# Altium footprint library PCB_Footprints.PcbLib: 303 footprints (part 1 of 19)
Each footprint in its own frame and in the unit in brackets; x right, y up, seen from the top. Pads: shape width x height; smd on the part's side, far side on the other; paste and mask are expansions set on the pad; w line width, h text height; cw(c..) or ccw(c..) is an arc to the next point about the centre after c.
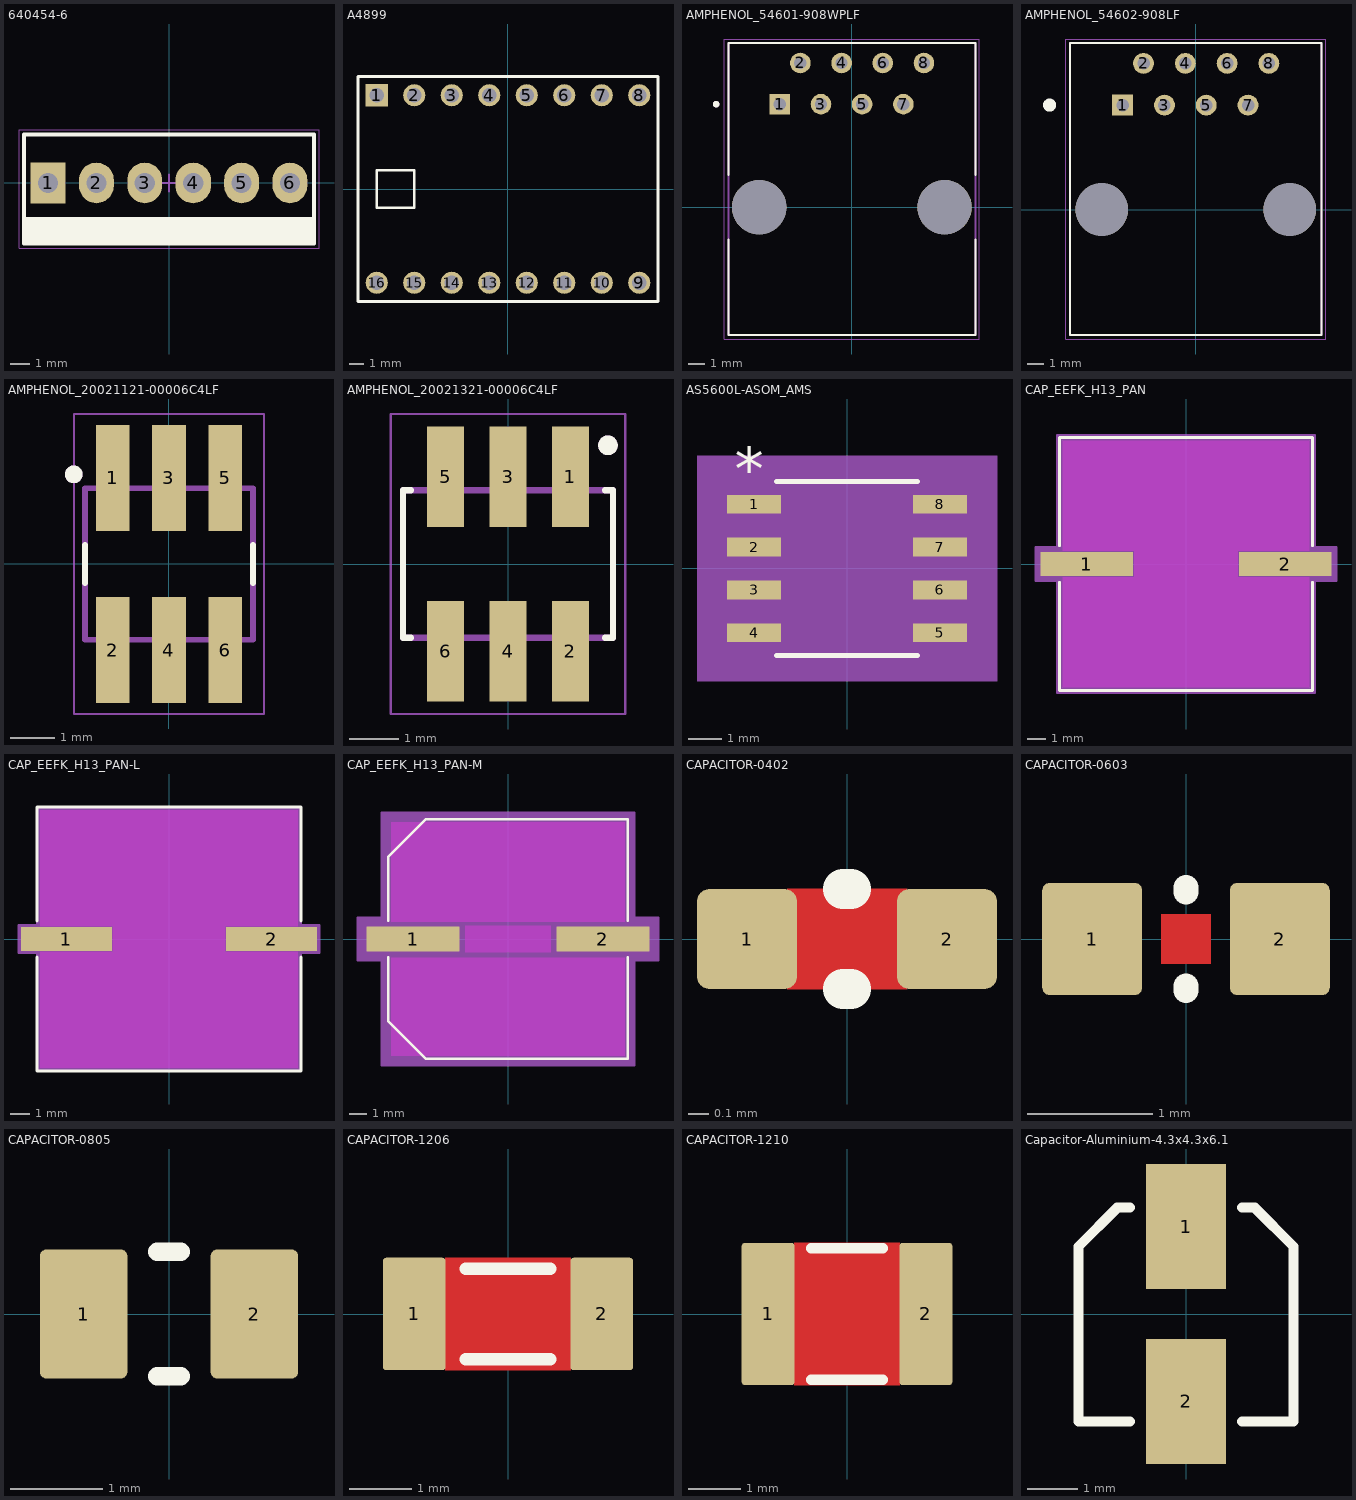
[diagram p0: the footprints below, top view; thin cyan lines are the x and y axes]

## 640454-6 [mil] "CONN HEADER MTA-100 VERT 6POS .100"
height 409.84
pads (6):
  rect 72x84 hole 42: 1(-250,0)
  oval 72x84 hole 42: 2(-150,0) 3(-50,0) 5(150,0) 6(250,0)
  oval 74x84 hole 42: 4(50,0)
Top Overlay:
  rectangle: -300,-125 300,-70
  lines w8: -300,-125 300,-125 300,100 -300,100 -300,-125
Mechanical 13:
  lines w3.94: -300,-125 300,-125 300,100 -300,100 -300,-125
Mechanical 15:
  lines w1.97: -310,-135 -310,110 310,110 310,-135 -310,-135
  lines w3.94: -17.72,0 17.72,0 ; 0,-17.72 0,17.72
3D body "c-640454-6-aa-3d.stp": height 394.88, standoff -140.16, extent -300.01,-125.2 299.99,99.99

## A4899 [mm] "Connector; Header; 2 Position"
pads (16):
  rect 1.5x1.5 hole 1: 1(-8.89,6.35)
  round 1.5 hole 1: 2(-6.35,6.35) 3(-3.81,6.35) 4(-1.27,6.35) 5(1.27,6.35) 6(3.81,6.35) 7(6.35,6.35) 8(8.89,6.35) 9(8.89,-6.35) 10(6.35,-6.35) 11(3.81,-6.35) 12(1.27,-6.35) 13(-1.27,-6.35) 14(-3.81,-6.35) 15(-6.35,-6.35) 16(-8.89,-6.35)
Top Overlay:
  lines w0.15: -8.89,-1.27 -8.89,1.27 -6.35,1.27 -6.35,-1.27 -8.89,-1.27
  lines w0.2: -10.16,-7.62 10.16,-7.62 10.16,5.715 10.16,6.985 10.16,7.62 -10.16,7.62 -10.16,-7.62

## AMPHENOL_54601-908WPLF [mm]
height 11.5
pads (10):
  rect 1.268x1.268 / inner round 1.268 / far side rect 1.268x1.268 hole 0.76: 1(-4.445,6.35)
  round 1.268 hole 0.76: 2(-3.175,8.89) 3(-1.905,6.35) 4(-0.635,8.89) 5(0.635,6.35) 6(1.905,8.89) 7(3.175,6.35) 8(4.445,8.89)
  round 3.35 hole 3.35 unplated: ""(-5.716,0) ""(5.716,0)
Top Overlay:
  circle w0.2: c-8.37,6.35 r0.1
  lines w0.127: -7.62,-1.995 -7.62,-7.88 7.62,-7.88 7.62,-1.995 ; -7.62,1.995 -7.62,10.12 7.62,10.12 7.62,1.995
Mechanical 13:
  circle w0.2: c-8.37,6.35 r0.1
  lines w0.127: -7.62,-7.88 7.62,-7.88 7.62,10.12 -7.62,10.12 -7.62,-7.88
Mechanical 15:
  lines w0.05: -7.87,-8.13 7.87,-8.13 7.87,10.37 -7.87,10.37 -7.87,-8.13
3D body "step_temp.STEP": height 11.5, standoff -4.25, extent -7.62,-7.88 7.62,10.12

## AMPHENOL_54602-908LF [mm] "RJ45"
pads (10):
  rect 1.268x1.268 / inner round 1.268 / far side rect 1.268x1.268 hole 0.76: 1(-4.445,6.35)
  round 1.268 hole 0.76: 2(-3.175,8.89) 3(-1.905,6.35) 4(-0.635,8.89) 5(0.635,6.35) 6(1.905,8.89) 7(3.175,6.35) 8(4.445,8.89)
  round 3.2 hole 3.2 unplated: ""(-5.715,0) ""(5.715,0)
Top Overlay:
  circle w0.4: c-8.89,6.35 r0.2
  lines w0.127: -7.65,-7.62 7.65,-7.62 7.65,10.12 -7.65,10.12 -7.65,-7.62
Mechanical 13:
  lines w0.127: -7.65,-7.62 7.65,-7.62 7.65,10.12 -7.65,10.12 -7.65,-7.62
Mechanical 15:
  lines w0.05: -7.9,-7.87 7.9,-7.87 7.9,10.37 -7.9,10.37 -7.9,-7.87
3D body "step_temp.STEP": height 12.7, standoff -3.5, extent -7.65,-7.62 7.65,10.12

## AMPHENOL_20021121-00006C4LF [mm]
pads (6):
  rect 0.76x2.4 smd mask+0.05: 1(-1.27,1.95) 2(-1.27,-1.95) 3(0,1.95) 4(0,-1.95) 5(1.27,1.95) 6(1.27,-1.95)
Top Overlay:
  circle w0.2: c-2.159,2.032 r0.1
  lines w0.127: -1.905,-0.43 -1.905,0.43 ; 1.905,-0.43 1.905,0.43
Mechanical 13:
  circle w0.2: c-2.159,2.032 r0.1
  lines w0.127: -1.905,-1.715 1.905,-1.715 1.905,1.715 -1.905,1.715 -1.905,-1.715
Mechanical 15:
  lines w0.05: -2.155,-3.4 2.155,-3.4 2.155,3.4 -2.155,3.4 -2.155,-3.4
3D body "step_temp.STEP": height 4.5, standoff 0, extent -1.905,-2.75 1.905,2.75

## AMPHENOL_20021321-00006C4LF [mm]
height 4.65
pads (6):
  rect 0.76x2.05 smd mask+0.05: 1(1.27,1.775) 2(1.27,-1.775) 3(0,1.775) 4(0,-1.775) 5(-1.27,1.775) 6(-1.27,-1.775)
Top Overlay:
  circle w0.2: c2.032,2.413 r0.1
  lines w0.127: -1.97,-1.5 -2.135,-1.5 -2.135,1.5 -1.97,1.5 ; 1.97,-1.5 2.135,-1.5 2.135,1.5 1.97,1.5
Mechanical 13:
  circle w0.2: c2.032,2.413 r0.1
  lines w0.127: -2.135,-1.5 -2.135,1.5 2.135,1.5 2.135,-1.5 -2.135,-1.5
Mechanical 15:
  lines w0.05: -2.385,-3.05 -2.385,3.05 2.385,3.05 2.385,-3.05 -2.385,-3.05
3D body "step_temp.STEP": height 4.5, standoff 0, extent -2.135,-2.25 2.135,2.25

## AS5600L-ASOM_AMS [mil]
pads (8):
  rect 63.11x22 smd paste+0 mask+0: 1(-108.56,75) 2(-108.56,25) 3(-108.56,-25) 4(-108.56,-75) 5(108.56,-75) 6(108.56,-25) 7(108.56,25) 8(108.56,75)
Top Overlay:
  lines w6: -82,-101.5 82,-101.5 ; -82,101.5 82,101.5
  text "*" at -131.06,92 h50
Bottom 3D Body (Mech5):
  region: 175.11,-131.5 -175.11,-131.5 -175.11,131.5 175.11,131.5
Mechanical 13:
  lines w0: -12,96.5 ccw(c0,96.5) 12,96.5
  lines w1: -118.11,-85 -118.11,-65 -77,-65 -77,-85 -118.11,-85 ; -118.11,-35 -118.11,-15 -77,-15 -77,-35 -118.11,-35 ; -118.11,15 -118.11,35 -77,35 -77,15 -118.11,15 ; -118.11,65 -118.11,85 -77,85 -77,65 -118.11,65 ; -77,-96.5 77,-96.5 77,96.5 -77,96.5 -77,-96.5 ; 77,-85 77,-65 118.11,-65 118.11,-85 77,-85 ; 77,-35 77,-15 118.11,-15 118.11,-35 77,-35 ; 77,15 77,35 118.11,35 118.11,15 77,15 ; 77,65 77,85 118.11,85 118.11,65 77,65
  text "*" at -74.5,43.5 h50
Mechanical 15:
  region: -97,-106 -160.11,-106 -160.11,106 -97,106 -97,116.5 97,116.5 97,106 160.11,106 160.11,-106 97,-106 97,-116.5 -97,-116.5
  lines w6: -160.11,-106 -160.11,106 -97,106 -97,116.5 97,116.5 97,106 160.11,106 160.11,-106 97,-106 97,-116.5 -97,-116.5 -97,-106 -160.11,-106
3D body "AS5600L-ASOM_AMS.step": height 69.09, standoff 0, extent -118.11,-96.5 118.11,96.5

## CAP_EEFK_H13_PAN [mil]
pads (2):
  rect 201x53 smd paste+0 mask+0: 1(-215,0) 2(215,0)
Top Layer keep-out:
  region: -267.5,-267.5 -267.5,-28.5 267.5,-28.5 267.5,-267.5
  region: -267.5,28.5 -267.5,267.5 267.5,267.5 267.5,28.5
  region: -112.5,-28.5 -112.5,28.5 112.5,28.5 112.5,-28.5
Top Overlay:
  lines w6: -274.5,-39.6 -274.5,-274.5 274.5,-274.5 274.5,-39.6 ; -274.5,39.6 -274.5,274.5 274.5,274.5 274.5,39.6
Keep-Out Layer:
  region: -112.5,-28.5 -112.5,28.5 112.5,28.5 112.5,-28.5
Mechanical 13:
  lines w1: -269.5,-134.75 -134.75,-269.5 ; -269.5,134.75 -134.75,269.5 ; -269.5,-269.5 -269.5,269.5 269.5,269.5 269.5,-269.5 -269.5,-269.5
Mechanical 15:
  region: -279.5,-36.5 -325.5,-36.5 -325.5,36.5 -279.5,36.5 -279.5,279.5 279.5,279.5 279.5,36.5 325.5,36.5 325.5,-36.5 279.5,-36.5 279.5,-279.5 -279.5,-279.5
  lines w6: -325.5,-36.5 -279.5,-36.5 -279.5,-279.5 279.5,-279.5 279.5,-36.5 325.5,-36.5 325.5,36.5 279.5,36.5 279.5,279.5 -279.5,279.5 -279.5,36.5 -325.5,36.5 -325.5,-36.5
3D body "CAP_EEFK_H13_PAN.step": height 553.11, standoff 0, extent -295.51,-269.49 295.51,269.49

## CAP_EEFK_H13_PAN-L [mil]
pads (2):
  rect 189x49 smd paste+0 mask+0: 1(-213,0) 2(213,0)
Top Layer keep-out:
  region: -267.5,-267.5 -267.5,-26.5 267.5,-26.5 267.5,-267.5
  region: -267.5,26.5 -267.5,267.5 267.5,267.5 267.5,26.5
  region: -116.5,-26.5 -116.5,26.5 116.5,26.5 116.5,-26.5
Top Overlay:
  lines w6: -274.5,-37.6 -274.5,-274.5 274.5,-274.5 274.5,-37.6 ; -274.5,37.6 -274.5,274.5 274.5,274.5 274.5,37.6
Keep-Out Layer:
  region: -116.5,-26.5 -116.5,26.5 116.5,26.5 116.5,-26.5
Mechanical 13:
  lines w1: -269.5,-134.75 -134.75,-269.5 ; -269.5,134.75 -134.75,269.5 ; -269.5,-269.5 -269.5,269.5 269.5,269.5 269.5,-269.5 -269.5,-269.5
Mechanical 15:
  region: -273.5,-28.5 -311.5,-28.5 -311.5,28.5 -273.5,28.5 -273.5,273.5 273.5,273.5 273.5,28.5 311.5,28.5 311.5,-28.5 273.5,-28.5 273.5,-273.5 -273.5,-273.5
  lines w6: -311.5,-28.5 -273.5,-28.5 -273.5,-273.5 273.5,-273.5 273.5,-28.5 311.5,-28.5 311.5,28.5 273.5,28.5 273.5,273.5 -273.5,273.5 -273.5,28.5 -311.5,28.5 -311.5,-28.5
3D body "CAP_EEFK_H13_PAN.step": height 553.11, standoff 0, extent -295.51,-269.49 295.51,269.49

## CAP_EEFK_H13_PAN-M [mil]
pads (2):
  rect 213x57 smd paste+0 mask+0: 1(-217,0) 2(217,0)
Top Layer keep-out:
  region: -267.5,39.37 -267.5,267.5 267.5,267.5 267.5,39.37
  region: -267.5,-267.5 -267.5,-43.31 267.5,-43.31 267.5,-267.5
  region: -98.43,-30.5 -98.43,30.5 98.43,30.5 98.43,-30.5
Top Overlay:
  lines w6: -274.5,-41.6 -274.5,-188.1 -188.1,-274.5 274.5,-274.5 274.5,-41.6 ; -274.5,41.6 -274.5,188.1 -188.1,274.5 274.5,274.5 274.5,41.6
Keep-Out Layer:
  region: -98.43,-30.5 -98.43,30.5 98.43,30.5 98.43,-30.5
Mechanical 13:
  lines w1: -269.5,-134.75 -134.75,-269.5 ; -269.5,134.75 -134.75,269.5 ; -269.5,-269.5 269.5,-269.5 269.5,269.5 -269.5,269.5 -269.5,-269.5
Mechanical 15:
  region: -289.5,-48.5 -343.5,-48.5 -343.5,48.5 -289.5,48.5 -289.5,289.5 289.5,289.5 289.5,48.5 343.5,48.5 343.5,-48.5 289.5,-48.5 289.5,-289.5 -289.5,-289.5
  lines w6: -343.5,-48.5 -343.5,48.5 -289.5,48.5 -289.5,289.5 289.5,289.5 289.5,48.5 343.5,48.5 343.5,-48.5 289.5,-48.5 289.5,-289.5 -289.5,-289.5 -289.5,-48.5 -343.5,-48.5
3D body "CAP_EEFK_H13_PAN.step": height 553.11, standoff 0, extent -295.51,-269.49 295.51,269.49

## CAPACITOR-0402 [mm] "Metric 1005, EIA 0402. Per Yageo Product Specification V2.6"
height 0.5
pads (2):
  rrect25% 0.5x0.5 smd: 1(-0.5,0) 2(0.5,0)
Top Layer:
  pour cut-out: -0.3,0.25 0.3,0.25 0.3,-0.25 -0.3,-0.25
Top Overlay:
  lines w0.2: -0.02,-0.25 0.02,-0.25 ; -0.02,0.25 0.02,0.25
3D body "JMK105BJ105MVHF.STEP": height 0.51, standoff 0.01, extent -0.5,-0.275 0.5,0.275

## CAPACITOR-0603 [mm] "Metric 1608, EIA 0603. Per Yageo Product Specification V2.2"
height 1
pads (2):
  rrect15% 0.8x0.9 smd: 1(-0.75,0) 2(0.75,0)
Top Layer:
  pour cut-out: -0.2,0.2 0.2,0.2 0.2,-0.2 -0.2,-0.2
Top Overlay:
  lines w0.2: 0,-0.413 0,-0.375 ; 0,0.375 0,0.413
3D body "User Library-Cap_0603.step": height 0.81, standoff -0.01, extent -0.93,-0.412 0.93,0.413

## CAPACITOR-0805 [mm] "Metric 2012, EIA 0805, Per Yageo Product Specification V2.2"
height 1
pads (2):
  rrect15% 0.95x1.4 smd: 1(-0.925,0) 2(0.925,0)
Top Overlay:
  lines w0.2: -0.125,-0.675 0.125,-0.675 ; -0.125,0.675 0.125,0.675
3D body "User Library-Cap_0805.step": height 1.26, standoff -0.01, extent -1.09,-0.637 1.09,0.638

## CAPACITOR-1206 [mm] "Metric 3216, EIA 1206, Per Yageo Product Specification V2.2"
height 1
pads (2):
  rrect10% 1x1.8 smd: 1(-1.5,0) 2(1.5,0)
Top Layer:
  pour cut-out: -1,0.9 1,0.9 1,-0.9 -1,-0.9
Top Overlay:
  lines w0.2: -0.675,-0.725 0.675,-0.725 ; -0.675,0.725 0.675,0.725
3D body "User Library-Cap_1206.step": height 1.61, standoff -0.01, extent -1.75,-0.812 1.75,0.813

## CAPACITOR-1210 [mm] "Metric 3225, EIA 1210. Per Yageo Product Specification V2.2"
height 1
pads (2):
  rrect10% 1x2.7 smd: 1(-1.5,0) 2(1.5,0)
Top Layer:
  pour cut-out: -1,1.35 1,1.35 1,-1.35 -1,-1.35
Top Overlay:
  lines w0.2: -0.675,-1.25 0.675,-1.25 ; -0.675,1.25 0.675,1.25
3D body "User Library-cap_1210.step": height 2.5, standoff 0, extent -1.6,-1.25 1.6,1.25

## Capacitor-Aluminium-4.3x4.3x6.1 [mm] "SMD Aluminium 4.3x4.3, according to Panasonic Case B in EEE-172"
height 6.1
pads (2):
  rect 1.6x2.5 smd: 1(0,1.75) 2(0,-1.75)
Top Overlay:
  lines w0.2: -1.125,-2.15 -2.15,-2.15 -2.15,1.35 -1.375,2.125 -1.125,2.125 ; 1.125,-2.15 2.15,-2.15 2.15,1.35 1.375,2.125 1.125,2.125
3D body "User Library-ALU-B-6.1mm.STEP": height 6.1, standoff 0, extent -2.15,-2.3 2.15,2.3